# Altium footprint library Colin.PcbLib: 11 footprints
Each footprint in its own frame and in the unit in brackets; x right, y up, seen from the top. Pads: shape width x height; smd on the part's side, far side on the other; paste and mask are expansions set on the pad; w line width, h text height; cw(c..) or ccw(c..) is an arc to the next point about the centre after c.
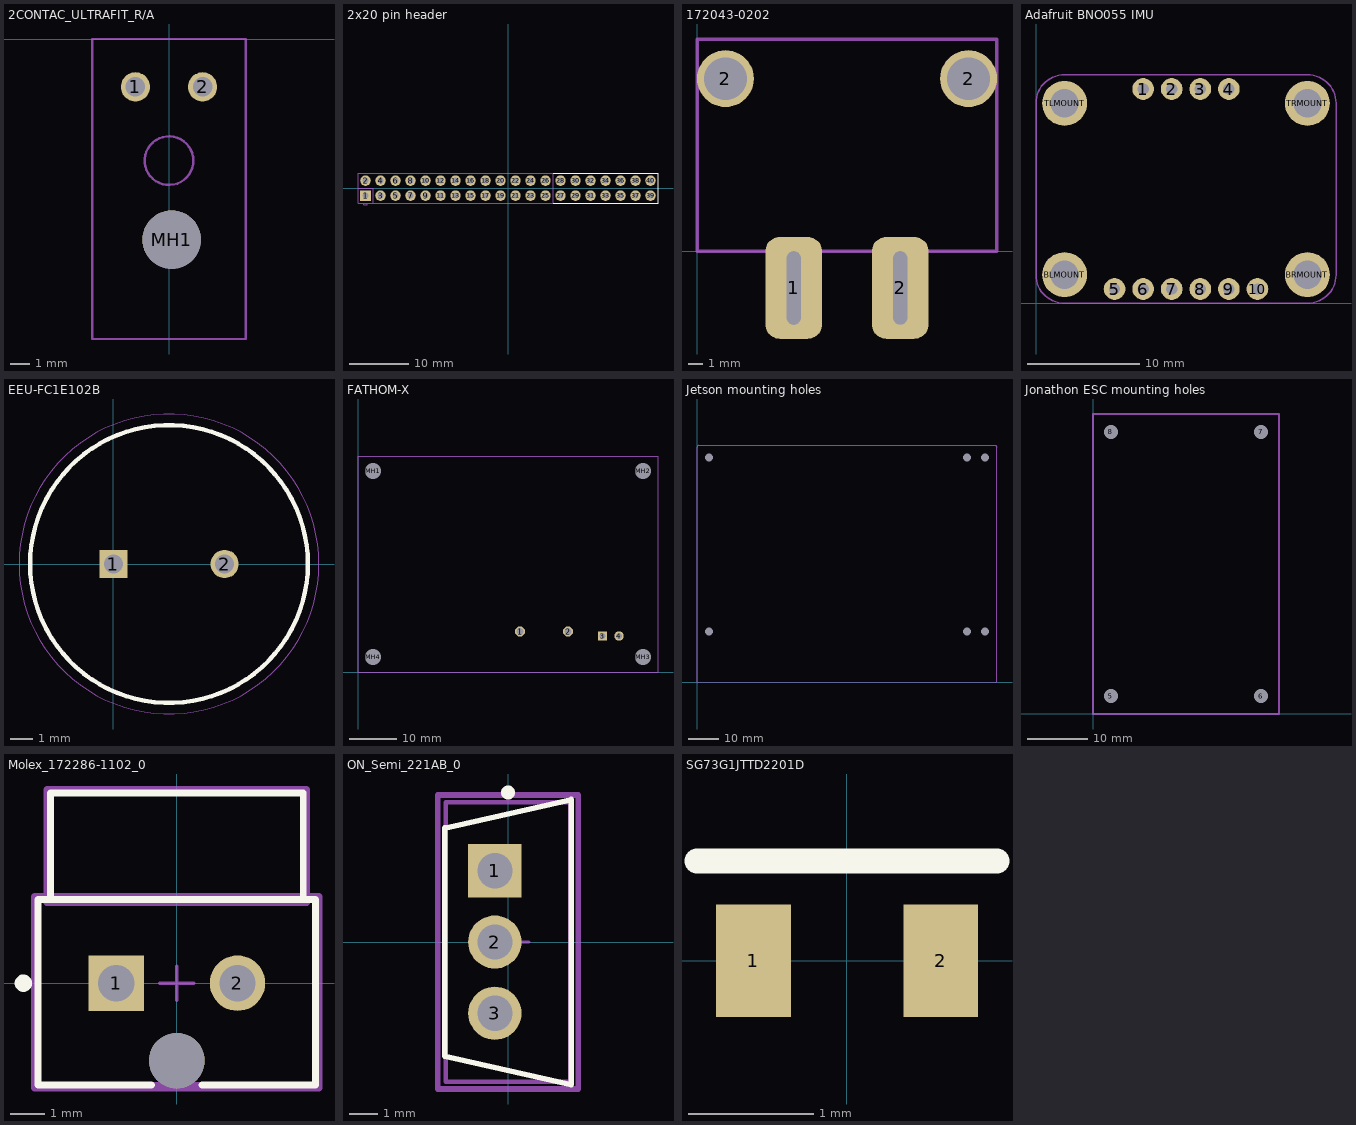
[diagram p0: the footprints below, top view; thin cyan lines are the x and y axes]

## 2CONTAC_ULTRAFIT_R/A [mm]
pads (3):
  round 1.53 hole 1.02: 1(-1.75,-2.5) 2(1.75,-2.5)
  round 3.05 hole 3.05 unplated: MH1(0.14,-10.47)
Mechanical 7:
  lines w0.127: -4,-15.66 4,-15.66 4,0 -4,0 -4,-15.66
Mechanical 9:
  circle w0.127: c0,-6.35 r1.27
3D body "172310-1202.STEP": height 8.56, standoff -3.6, extent -4.49,-17.65 4.51,-2.023

## 2x20 pin header [mil]
pads (40):
  rect 70x70 / inner round 64.67 / far side rect 70x70 hole 39.37: 1(-950,-50)
  round 70 hole 39.37: 2(-950,50) 3(-850,-50) 4(-850,50) 5(-750,-50) 6(-750,50) 7(-650,-50) 8(-650,50) 9(-550,-50) 10(-550,50) 11(-450,-50) 12(-450,50) 13(-350,-50) 14(-350,50) 15(-250,-50) 16(-250,50) 17(-150,-50) 18(-150,50) 19(-50,-50) 20(-50,50) 21(50,-50) 22(50,50) 23(150,-50) 24(150,50) 25(250,-50) 26(250,50) 27(350,-50) 28(350,50) 29(450,-50) 30(450,50) 31(550,-50) 32(550,50) 33(650,-50) 34(650,50) 35(750,-50) 36(750,50) 37(850,-50) 38(850,50) 39(950,-50) 40(950,50)
Top Overlay:
  lines w5: 300,-100 1000,-100 1000,100 300,100
Mechanical 7:
  lines w5: -1000,0 -900,0 -900,-100 ; -1000,0 -1000,-100 -962.5,-100 ; -1000,0 -1000,100 300,100 300,-100 -900,-100 ; -962.5,-100 -962.5,-112.5 -937.5,-112.5 -937.5,-100 ; -962.5,-100 -937.5,-100 ; -937.5,-100 -900,-100
  text "1" at -962.5,-162.5 h34
3D body "2x20 Male Pin Header.STEP": height 414.96, standoff -118.11, extent -992.13,-98.43 978.15,98.43

## 172043-0202 [mm] "Super Sabre R/A 2 position connector"
pads (4):
  rrect50% 4x7.15 / inner round 4 / far side rrect50% 4x7.15 hole 5.15 slot 1 at 0 deg: 1(6.79,-2.575)
  round 4 hole 3: 2(1.99,12.14) 2(19.08,12.14)
  rrect50% 4x7.15 / inner round 4 / far side rrect50% 4x7.14 hole 5.15 slot 1 at 0 deg: 2(14.28,-2.575)
Mechanical 7:
  lines w0.254: 0,0 0,14.91 21.07,14.91 21.07,0 0,0
3D body "1720430202.stp": height 13.08, standoff -4.12, extent -0.042,-4.688 21.04,15.188

## Adafruit BNO055 IMU [mm]
pads (14):
  round 1.93 hole 1: 1(9.525,19.05) 2(12.065,19.05) 3(14.605,19.05) 4(17.145,19.05) 5(6.985,1.27) 6(9.525,1.27) 7(12.065,1.27) 8(14.605,1.27) 9(17.145,1.27) 10(19.685,1.27)
  round 4 hole 2.5: BLMOUNT(2.54,2.54) BRMOUNT(24.13,2.54) TLMOUNT(2.54,17.78) TRMOUNT(24.13,17.78)
Mechanical 7:
  lines w0.127: 0,2.54 ccw(c2.54,2.54) 2.54,0 24.13,0 ccw(c24.13,2.54) 26.67,2.54 26.67,17.78 ccw(c24.13,17.78) 24.13,20.32 2.54,20.32 ccw(c2.54,17.78) 0,17.78 0,2.54
3D body "Adafruit_BNO055.STEP": height 4.15, standoff -0.05, extent 0,0 26.67,20.32

## EEU-FC1E102B [mm]
pads (2):
  rect 1.275x1.275 hole 0.85: 1(0,0)
  round 1.275 hole 0.85: 2(5,0)
Top Overlay:
  circle w0.2: c2.5,0 r6.25
Mechanical 13:
  circle w0.1: c2.5,0 r6.25
Mechanical 15:
  circle w0.05: c2.5,0 r6.75
3D body "EEU-FC1E102.stp": height 22, standoff -10, extent -4,-6.5 9,6.5

## FATHOM-X [mil]
pads (8):
  round 86 hole 55: 1(1350,337.5) 2(1750,337.5)
  rect 78x78 / inner round 72.06 / far side rect 78x78 hole 47.24: 3(2037.5,300)
  round 78 hole 47.24: 4(2175.3,300)
  round 130 hole 130 unplated: MH1(125,1675) MH2(2375,1675) MH3(2375,125) MH4(125,125)
Mechanical 7:
  lines w5: 0,0 0,1800 2500,1800 2500,0 0,0
3D body "FATHOMX-ASM-FATHOM-X-R1.STEP": height 661.42, standoff 0, extent 0,0 2542.93,1834.64

## Jetson mounting holes [mm]
pads (6):
  round 1 hole 2.75: 4(4,17) 4(4,75) 4(90,17) 4(90,75) 4(96,17) 4(96,75)
Mechanical 2:
  lines w0.254: 0,0 0,78.4 cw(c0.6,78.4) 0.6,79 99.4,79 cw(c99.4,78.4) 100,78.4 100,0.6 cw(c99.4,0.6) 99.4,0 0,0
3D body "Jetson NX.STEP": height 24.69, standoff 0.66, extent 0,-2.511 100,78.511

## Jonathon ESC mounting holes [mm]
pads (4):
  round 1.524 hole 2.4: 5(3,3) 6(28,3) 7(28,47) 8(3,47)
Mechanical 2:
  lines w0.254: 0,0 0,50 31,50 31,0 0,0

## Molex_172286-1102_0 [mm]
pads (3):
  rect 1.6x1.6 hole 1.05 paste-1000 mask+0: 1(-1.75,0)
  round 1.6 hole 1.05 paste-1000 mask+0: 2(1.75,0)
  round 1.6 hole 1.6 unplated paste-1000 mask+0: ""(0,-2.23)
Top Overlay:
  circle w0.25: c-4.425,0 r0.125
  lines w0.2: -0.725,-2.93 -4,-2.93 -4,2.42 4,2.42 4,-2.93 0.725,-2.93 ; -3.645,2.42 3.645,2.42 3.645,5.48 -3.645,5.48 -3.645,2.42
Mechanical 10:
  lines w0.2: -4.1,-3.015 4.1,-3.015 4.1,2.505 -4.1,2.505 -4.1,-3.015 ; -3.745,2.32 3.745,2.32 3.745,5.58 -3.745,5.58 -3.745,2.32
  text ".Designator" at 0,3.95 h1
Mechanical 12:
  lines w0.15: -4,-2.93 4,-2.93 4,2.42 -4,2.42 -4,-2.93 ; -3.645,2.42 3.645,2.42 3.645,5.48 -3.645,5.48 -3.645,2.42
Mechanical 15:
  lines w0.1: -0.489,0 0.489,0 ; 0,-0.489 0,0.489
  lines w0.2: -4.1,-3.015 4.1,-3.015 4.1,2.505 -4.1,2.505 -4.1,-3.015 ; -3.745,2.32 3.745,2.32 3.745,5.58 -3.745,5.58 -3.745,2.32
3D body "3dmodel.step": height 0.25, standoff 0, extent -3.745,2.32 3.745,5.58

## ON_Semi_221AB_0 [mm]
pads (3):
  rect 1.9x1.9 hole 1.25 paste-1000 mask+0: 1(-0.467,2.54)
  round 1.9 hole 1.25 paste-1000 mask+0: 2(-0.467,0) 3(-0.467,-2.54)
Top Overlay:
  circle w0.25: c0,5.33 r0.125
  lines w0.2: 2.254,-5.08 -2.254,-4.064 -2.254,4.064 2.254,5.08 ; 2.254,-5.03 2.254,5.03
Mechanical 10:
  lines w0.2: -2.51,-5.24 -2.51,5.24 2.51,5.24 2.51,-5.24 -2.51,-5.24
  text ".Designator" at 0,0 h1
Mechanical 12:
  lines w0.15: -2.222,-4.985 -2.222,4.985 2.222,4.985 2.222,-4.985 -2.222,-4.985
Mechanical 15:
  lines w0.1: -0.753,0 0.753,0 ; 0,-0.753 0,0.753
  lines w0.2: -2.51,-5.24 -2.51,5.24 2.51,5.24 2.51,-5.24 -2.51,-5.24
3D body "3dmodel.step": height 0.25, standoff 0, extent -2.51,-5.24 2.51,5.24

## SG73G1JTTD2201D [mm]
pads (2):
  rect 0.6x0.9 smd: 1(-0.75,0) 2(0.75,0)
Top Overlay:
  lines w0.2: -1.2,0.8 1.2,0.8